# Altium footprint library SparkFun-Retired.PCBLIB: 303 footprints (part 3 of 19)
Each footprint in its own frame and in the unit in brackets; x right, y up, seen from the top. Pads: shape width x height; smd on the part's side, far side on the other; paste and mask are expansions set on the pad; w line width, h text height; cw(c..) or ccw(c..) is an arc to the next point about the centre after c.
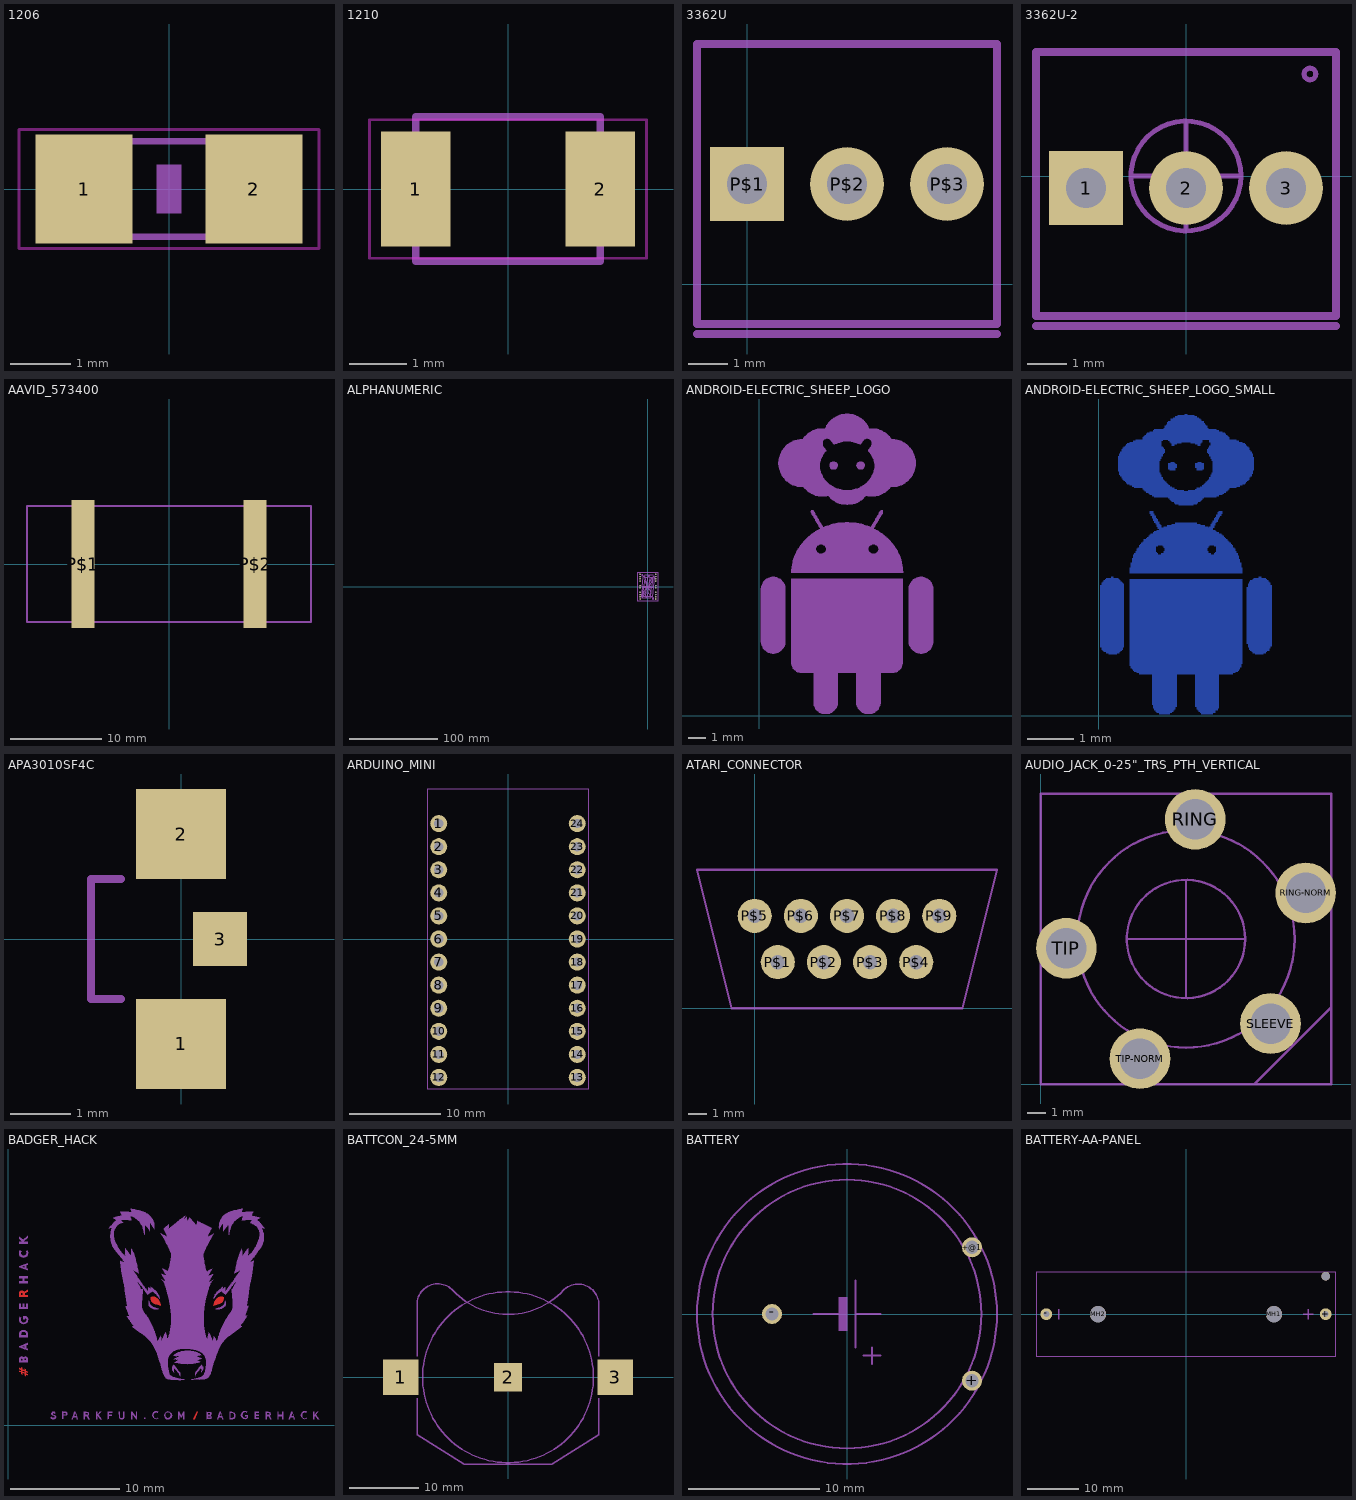
[diagram p2: the footprints below, top view; thin cyan lines are the x and y axes]

## 1206 [mil]
pads (2):
  rect 62.99x70.87 smd: 1(-55.12,0) 2(55.12,0)
Top keep-out:
  lines w2: -97.36,-38.7 97.36,-38.7 97.36,38.7 -97.36,38.7 -97.36,-38.7
tDocu:
  region: -67,-33.5 -67,33.43 -37.47,33.43 -37.47,-33.5
  region: 37.47,-33.43 37.47,33.5 67,33.5 67,-33.43
  lines w4: -37.99,-30.98 37.99,-30.98 ; -37.99,30.98 37.99,30.98
tGlue:
  region: -7.87,-15.75 -7.87,15.75 7.87,15.75 7.87,-15.75

## 1210 [mm]
pads (2):
  rect 1.2x2 smd: 1(-1.6,0) 2(1.6,0)
Top keep-out:
  lines w0.051: -2.4,-1.2 2.4,-1.2 2.4,1.2 -2.4,1.2 -2.4,-1.2
tDocu:
  lines w0.127: -1.6,-1.25 1.6,-1.25 1.6,1.25 -1.6,1.25 -1.6,-1.25

## 3362U [mil]
pads (3):
  rect 74x74 / inner round 68.37 / far side rect 74x74 hole 40: P$1(0,100)
  round 74 hole 40: P$2(100,100) P$3(200,100)
tPlace:
  lines w8: -50,-50 250,-50 ; -50,-40 250,-40 250,240 -50,240 -50,-40

## 3362U-2 [mil]
pads (3):
  rect 74x74 / inner round 68.37 / far side rect 74x74 hole 40: 1(-100,-12)
  round 74 hole 40: 2(0,-12) 3(100,-12)
tDocu:
  circle w5: c0,0 r55
  circle w5: c124,102 r5.83
  lines w5: -55,0 55,0 ; 0,-55 0,55
  lines w8: -150,-150 150,-150
tPlace:
  lines w8: -150,-140 150,-140 150,124 -150,124 -150,-140

## AAVID_573400 [mil]
pads (2):
  rect 100x550 smd: P$1(-370,0) P$2(370,0)
tDocu:
  region: -395,-250 -395,250 -345,250 -345,-250
  region: 345,-250 345,250 395,250 395,-250
  lines w8: -610,-250 610,-250 610,250 -610,250 -610,-250

## ALPHANUMERIC [mil]
pads (20):
  round 66.93 hole 35.43: 1(-350,550) 2(-350,450) 3(-350,350) 4(-350,250) 6(-350,50) 7(-350,-50) 9(-350,-250) 10(-350,-350) 11(-350,-450) 12(-350,-550) 13(350,-550) 14(350,-450) 15(350,-350) 16(350,-250) 18(350,-50) 19(350,50) 21(350,250) 22(350,350) 23(350,450) 24(350,550)
tPlace:
  circle w8: c-250,510 r29.15
  circle w8: c230,-525 r26.93
  lines w8: -450,-650 450,-650 450,650 -450,650 -450,-650 ; -300,-425 -260,-35 -215,-35 -190,-70 -225,-400 -275,-450 -300,-425 ; -270,-485 -230,-440 -110,-440 -75,-475 -75,-505 -250,-505 -270,-485 ; -255,5 -210,5 -175,45 -135,400 -190,460 -210,425 -255,5 ; -205,-400 -95,-215 -75,-75 -190,-255 -205,-400 ; -195,-15 -170,-50 -75,-50 -30,-15 -60,25 -160,25 -195,-15 ; -175,475 -125,425 -5,425 35,465 35,500 -150,500 -175,475 ; -130,255 ccw(c-6492.5,1007.5) -115,395 -40,180 -55,50 -130,255 ; -100,-415 -65,-450 -30,-415 15,-75 -10,-25 -55,-70 -100,-415 ; -50,-505 -50,-475 -20,-440 105,-440 155,-480 135,-505 -50,-505 ; -35,45 -5,0 30,45 75,415 45,450 5,410 -35,45 ; 15,-15 40,-55 145,-55 185,-15 150,25 55,25 15,-15 ; 20,-225 105,-415 120,-280 35,-75 20,-225 ; 50,45 185,265 200,395 70,180 50,45 ; 55,460 55,500 240,500 255,470 220,425 90,425 55,460 ; 125,-420 170,-455 195,-440 245,-30 200,-30 160,-70 125,-420 ; 175,40 205,0 250,0 300,415 275,460 220,400 175,40

## ANDROID-ELECTRIC_SHEEP_LOGO [mil]
tPlace:
  drawing of 1370 lines, arcs and shapes, not listed

## ANDROID-ELECTRIC_SHEEP_LOGO_SMALL [mil]
Bottom:
  drawing of 512 lines, arcs and shapes, not listed

## APA3010SF4C [mm]
pads (3):
  rect 1.5x1.5 smd: 1(0,-1.75) 2(0,1.75)
  rect 0.9x0.9 smd: 3(0.65,0)
tPlace:
  lines w0.127: -1,-1 -1.5,-1 -1.5,1 -1,1

## ARDUINO_MINI [mil]
pads (24):
  round 74 hole 40: 1(-300,500) 2(-300,400) 3(-300,300) 4(-300,200) 5(-300,100) 6(-300,0) 7(-300,-100) 8(-300,-200) 9(-300,-300) 10(-300,-400) 11(-300,-500) 12(-300,-600) 13(300,-600) 14(300,-500) 15(300,-400) 16(300,-300) 17(300,-200) 18(300,-100) 19(300,0) 20(300,100) 21(300,200) 22(300,300) 23(300,400) 24(300,500)
tDocu:
  lines w5: -350,-650 -350,650 350,650 350,-650 -350,-650

## ATARI_CONNECTOR [mil]
pads (9):
  round 74 hole 31.5: P$1(50,100) P$2(150,100) P$3(250,100) P$4(350,100) P$5(0,200) P$6(100,200) P$7(200,200) P$8(300,200) P$9(400,200)
tPlace:
  lines w5: -125,300 525,300 450,0 -50,0 -125,300

## AUDIO_JACK_0-25"_TRS_PTH_VERTICAL [mil]
pads (5):
  round 129.91 hole 86.61: RING(330.71,566.93) RING-NORM(566.93,409.45) SLEEVE(491.97,130.08) TIP(55.12,291.34) TIP-NORM(212.6,55.12)
tPlace:
  circle w5: c311.02,311.02 r126.57
  circle w5: c311.02,311.02 r232.28
  lines w5: 185.04,311.02 437.01,311.02 ; 311.02,185.04 311.02,437.01 ; 456.69,0 0,0 0,622.05 622.05,622.05 622.05,165.35 ; 456.69,0 622.05,0 622.05,165.35 ; 456.69,0 622.05,165.35

## BADGER_HACK [mil]
Top:
  region: 668.5,21.26 663.78,21.26 676.38,47.64 680.71,47.64
  region: 531.5,433.86 530.32,433.86 529.13,434.25 527.95,434.65 526.77,434.65 525.59,435.04 524.41,435.43 523.62,435.83 522.44,436.61 521.26,437.01 520.47,437.8 519.29,438.19 518.5,438.98 517.72,439.76 516.54,440.55 515.75,441.73 514.96,442.52 514.17,443.31 513.78,444.49 513.39,445.28 512.99,446.06 512.6,447.24 512.2,448.03 511.81,449.21 511.42,450 511.02,451.18 511.02,451.97 511.02,453.15 510.63,453.94 510.63,455.12 510.63,456.3 510.63,457.09 510.63,458.27 510.63,458.66 510.63,459.06 510.63,459.45 511.02,459.45 511.42,459.45 512.99,459.84 514.57,460.24 515.75,460.24 517.32,460.63 518.5,460.63 520.08,460.63 521.26,460.63 522.44,460.63 524.02,460.24 525.2,460.24 526.38,459.84 527.56,459.06 529.13,458.66 530.32,457.87 531.5,457.09 532.68,455.91 533.46,455.51 534.25,454.72 535.04,453.94 535.83,453.15 536.61,452.76 537.4,451.97 537.8,451.18 538.58,450.39 538.98,449.61 539.76,448.82 540.16,448.03 540.94,447.24 541.34,446.06 541.73,445.28 542.13,444.49 542.91,443.7 542.91,443.31 543.31,442.91 543.7,442.13 543.7,440.94 544.09,439.76 544.49,438.58 544.88,437.4 545.28,436.22 545.67,434.65 546.06,433.46 546.46,432.28 546.46,431.5 546.85,430.71 546.85,429.92 547.24,429.53 547.24,429.13 546.46,429.53 545.28,429.92 544.49,429.92 543.7,430.32 542.52,430.71 541.73,430.71 540.94,431.1 539.76,431.5 538.98,431.89 537.8,432.28 536.61,432.28 535.83,432.68 534.65,433.07 533.86,433.46 532.68,433.46
  region: 772.83,458.27 772.83,457.09 772.83,456.3 772.83,455.12 772.83,453.94 772.44,453.15 772.44,451.97 772.05,451.18 772.05,450 771.65,449.21 771.26,448.03 770.87,447.24 770.47,446.06 770.08,445.28 769.68,444.49 769.29,443.31 768.5,442.52 767.72,441.73 766.93,440.94 766.14,440.16 765.35,439.76 764.57,438.98 763.39,438.58 762.6,437.8 761.42,437.4 760.24,437.01 759.06,436.22 757.87,435.83 756.69,435.43 755.51,435.04 754.33,434.65 753.15,434.25 751.97,433.86 750.79,433.46 749.61,433.46 748.82,433.07 747.64,432.68 746.85,432.28 746.06,432.28 744.88,431.89 744.09,431.5 742.91,431.1 742.13,430.71 741.34,430.71 740.16,430.32 739.37,429.92 738.19,429.92 737.4,429.53 736.22,429.13 736.22,429.53 736.22,429.92 736.61,430.71 736.61,431.5 737.01,432.28 737.4,433.46 737.8,434.65 738.19,436.22 738.58,437.4 738.98,438.58 738.98,439.76 739.37,440.94 739.76,442.13 740.16,442.91 740.55,443.31 740.55,443.7 740.94,444.49 741.73,445.28 742.13,446.06 742.52,447.24 742.91,448.03 743.7,448.82 744.09,449.61 744.88,450.39 745.67,451.18 746.06,451.97 746.85,452.76 747.64,453.15 748.43,453.94 749.21,454.72 750,455.51 750.79,455.91 751.97,457.09 753.15,457.87 754.33,458.66 755.91,459.06 757.09,459.84 758.27,460.24 759.45,460.24 761.02,460.63 762.2,460.63 763.39,460.63 764.96,460.63 766.14,460.63 767.72,460.24 768.9,460.24 770.47,459.84 771.65,459.45 772.05,459.45 772.44,459.45 772.83,459.45 772.83,459.06 772.83,458.66
  region: 54.72,198.43 54.72,194.09 59.06,192.52 59.06,188.19 54.72,189.76 54.72,185.43 59.06,183.46 59.06,177.95 62.2,175.98 62.2,181.5 70.08,177.95 70.08,182.28 62.2,185.43 62.2,190.16 70.08,187.01 70.08,191.34 62.2,194.49 62.2,200 59.06,202.36 59.06,196.85
  region: 45.67,207.87 45.67,202.36 37.8,205.91 37.8,201.18 45.67,196.85 45.67,192.52 37.8,195.67 37.8,191.34 46.46,188.98 46.46,183.46 50,181.5 50,187.01 54.72,185.43 54.72,189.76 50,191.34 50,195.67 54.72,194.09 54.72,198.43 50,200 50,205.91
  region: 37.8,472.44 37.8,460.63 70.08,460.63 70.08,466.93 57.87,466.93 57.87,472.83 70.08,479.13 70.08,485.83 56.69,478.35 56.3,478.35 55.91,478.74 55.51,479.13 55.12,479.53 54.72,479.53 54.33,479.92 53.94,479.92 53.54,480.32 53.15,480.71 52.76,480.71 52.36,481.1 51.97,481.1 51.57,481.1 50.79,481.5 50.39,481.5 50,481.89 50,474.41 50.39,474.41 50.39,474.02 50.79,474.02 51.18,474.02 51.57,473.62 51.97,473.62 51.97,473.23 51.97,472.83 51.97,466.93 44.49,466.93 43.31,466.93 43.31,471.65 43.7,471.65 43.7,472.05 44.09,472.05 44.09,472.44
  region: 37.8,472.44 44.09,472.44 44.09,472.83 44.49,472.83 44.49,473.23 44.88,473.62 44.88,474.02 45.28,474.41 45.28,474.8 45.67,474.8 45.67,475.2 46.06,475.59 46.46,475.59 46.46,475.98 46.85,475.98 47.24,475.98 47.64,475.98 48.03,475.98 48.43,475.98 48.82,475.98 48.82,475.59 49.21,475.59 49.21,475.2 49.61,475.2 49.61,474.8 50,474.41 50,481.89 49.61,481.89 49.21,481.89 49.21,482.28 48.82,482.28 48.82,482.68 48.43,482.68 48.03,482.68 46.85,482.68 46.06,482.68 44.88,482.28 44.09,481.89 43.31,481.5 42.52,481.1 41.73,480.32 40.94,479.92 40.16,479.13 39.76,478.35 38.98,477.56 38.58,476.77 38.19,475.59 38.19,474.8 37.8,473.62 37.8,472.83
Top Solder:
  drawing of 7 lines, arcs and shapes, not listed
tPlace:
  drawing of 50 lines, arcs and shapes, not listed

## BATTCON_24-5MM [mil]
pads (3):
  rect 200x200 smd: 1(-605,0) 3(605,0)
  rect 160x160 smd: 2(0,0)
tDocu:
  circle w8: c0,0 r482.28
tPlace:
  lines w8: -513.39,-118.11 -513.39,-324.41 -245.67,-489.76 245.67,-489.76 513.39,-324.41 513.39,-118.11 ; -513.39,118.11 -513.39,408.66 cw(c-396.55,410.4) -308.66,487.4 ccw(c0.13,778.87) 312.6,491.34 ; 308.66,487.4 cw(c395.52,407.71) 513.39,408.66 513.39,118.11

## BATTERY [mil]
pads (3):
  round 60 hole 40: +(375,-200) +@1(375,200) -(-225,0)
tPlace:
  circle w6: c0,0 r450
  circle w6: c0,0 r403
  region: -25,-50 -25,50 0,50 0,-50
  lines w6: -100,0 -25,0 ; 25,-100 25,0 ; 25,100 25,0 ; 50,-125 100,-125 ; 75,-150 75,-100 ; 100,0 25,0

## BATTERY-AA-PANEL [mil]
pads (5):
  round 90.55 hole 46.06: +(1079.92,0) -(-1079.92,0)
  round 125.2 hole 125.2 unplated: MH1(679.92,0) MH2(-679.92,0)
  round 66.93 hole 66.93 unplated: MH3(1079.92,294.09)
tDocu:
  lines w5: -1159.84,-325 -1159.84,325 1159.84,325 1159.84,-325 -1159.84,-325
tPlace:
  lines w9.84: -984.25,-39.37 -984.25,39.37 ; 905.51,0 984.25,0 ; 944.88,-39.37 944.88,39.37
Reference:
  text "(layout parts on top layer)" at -236.22,275.59 h37.2